# Altium footprint library IND_SMD.PcbLib: 118 footprints (part 1 of 8)
Each footprint in its own frame and in the unit in brackets; x right, y up, seen from the top. Pads: shape width x height; smd on the part's side, far side on the other; paste and mask are expansions set on the pad; w line width, h text height; cw(c..) or ccw(c..) is an arc to the next point about the centre after c.
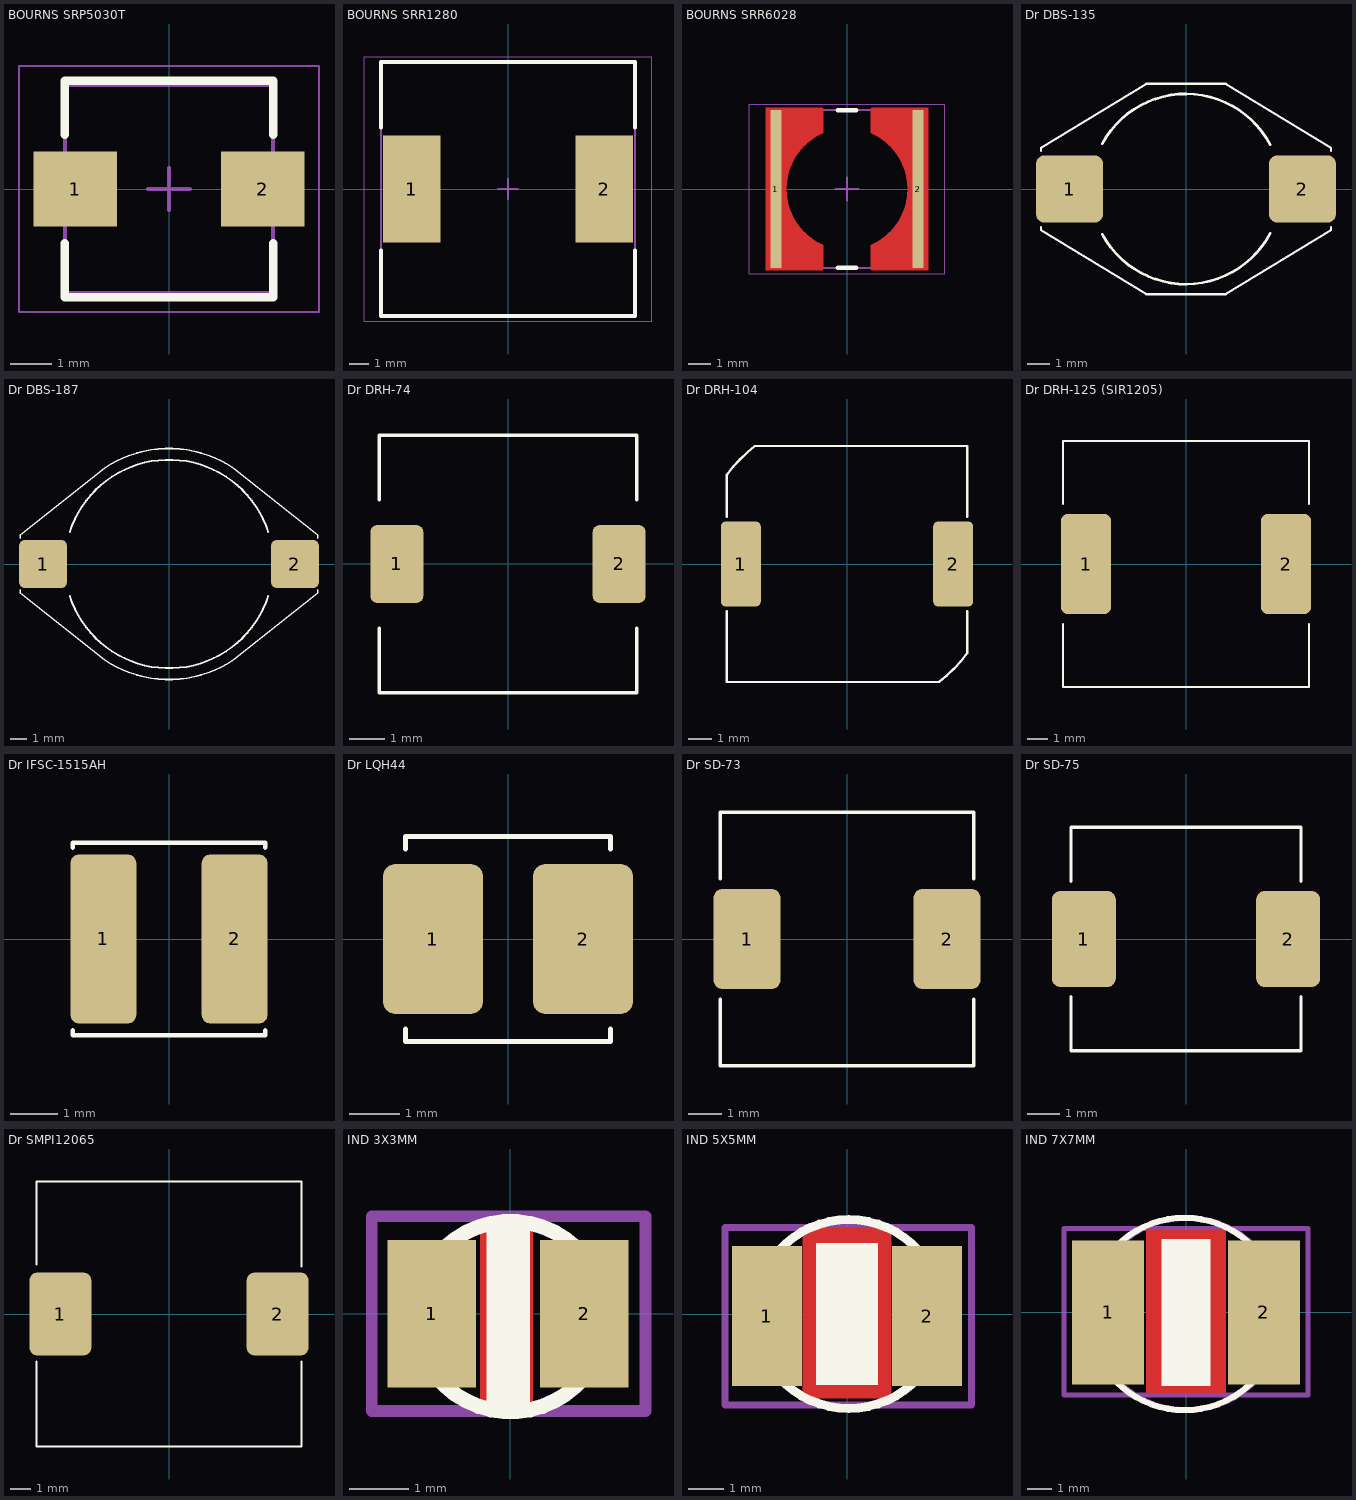
[diagram p0: the footprints below, top view; thin cyan lines are the x and y axes]

## BOURNS SRP5030T [mm] "Precision Wire Wound Inductor, 2-Leads, Body 5.70x5.20mm, IPC Medium Density"
height 3
pads (2):
  rect 2x1.8 smd: 1(-2.25,0) 2(2.25,0)
Top Overlay:
  lines w0.2: -2.5,-1.3 -2.5,-2.6 2.5,-2.6 2.5,-1.3 ; -2.5,1.3 -2.5,2.6 2.5,2.6 2.5,1.3
Mechanical 13:
  lines w0.1: -2.5,-2.5 -2.5,2.5 2.5,2.5 2.5,-2.5 -2.5,-2.5
Mechanical 15:
  lines w0.05: -3.6,-2.95 -3.6,2.95 3.6,2.95 3.6,-2.95 -3.6,-2.95
  lines w0.1: -0.5,0 0.5,0 ; 0,-0.5 0,0.5
3D body "Bourns SRP5030T.STEP": height 3, standoff 0, extent -2.85,-2.6 2.85,2.6

## BOURNS SRR1280 [mm] "Precision Wire Wound Inductor, 2-Leads, Body 12.50x12.50mm, IPC Medium Density"
height 8
pads (2):
  rect 2.9x5.4 smd: 1(-4.85,0) 2(4.85,0)
Top Overlay:
  lines w0.2: -6.4,-3.1 -6.4,-6.4 6.4,-6.4 6.4,-3.1 ; -6.4,3.1 -6.4,6.4 6.4,6.4 6.4,3.1
Mechanical 13:
  lines w0.1: -6.4,-6.4 -6.4,6.4 6.4,6.4 6.4,-6.4 -6.4,-6.4
Mechanical 15:
  lines w0.05: -7.225,-6.65 -7.225,6.65 7.225,6.65 7.225,-6.65 -7.225,-6.65
  lines w0.1: -0.5,0 0.5,0 ; 0,-0.5 0,0.5
3D body "SRR1280.STEP": height 7.9, standoff 0, extent -6.25,-6.25 6.25,6.25

## BOURNS SRR6028 [mm] "Precision Wire Wound Inductor, 2-Leads, Body 6.80x6.80mm, IPC Medium Density"
height 3
pads (2):
  rect 0.5x7 smd: 1(-3.15,0) 2(3.15,0)
Top Layer:
  region: 3.6,3.6 1.1,3.6 1.1,2.5 1.4,2.4 1.7,2.1 1.9,2 2.1,1.7 2.3,1.4 2.5,1 2.6,0.7 2.7,0.3 2.7,0 3.6,0
  region: 3.6,-3.6 1.1,-3.6 1.1,-2.5 1.4,-2.4 1.7,-2.1 1.9,-2 2.1,-1.7 2.3,-1.4 2.5,-1 2.6,-0.7 2.7,-0.3 2.7,0 3.6,0
  region: -3.6,-3.6 -1.1,-3.6 -1.1,-2.5 -1.4,-2.4 -1.7,-2.1 -1.9,-2 -2.1,-1.7 -2.3,-1.4 -2.5,-1 -2.6,-0.7 -2.7,-0.3 -2.7,0 -3.6,0
  region: -3.6,3.6 -1.1,3.6 -1.1,2.5 -1.4,2.4 -1.7,2.1 -1.9,2 -2.1,1.7 -2.3,1.4 -2.5,1 -2.6,0.7 -2.7,0.3 -2.7,0 -3.6,0
  lines w0.1: -1.1,-3.55 -1.1,-2.5 ; -1.1,-2.5 cw(c0,0) -2.731,0 cw(c0,0) -1.1,2.5 ; -1.1,2.5 -1.1,3.55 ; 1.1,-3.55 1.1,-2.5 ; 1.1,-2.5 ccw(c0,0) 2.731,0 ccw(c0,0) 1.1,2.5 ; 1.1,2.5 1.1,3.55
Top Overlay:
  lines w0.2: -0.4,-3.5 0.4,-3.5 ; -0.4,3.5 0.4,3.5
Mechanical 13:
  lines w0.1: -3.5,-3.5 3.5,-3.5 3.5,3.5 -3.5,3.5 -3.5,-3.5
Mechanical 15:
  lines w0.05: -4.325,-3.75 4.325,-3.75 4.325,3.75 -4.325,3.75 -4.325,-3.75
  lines w0.1: -0.5,0 0.5,0 ; 0,-0.5 0,0.5
3D body "Bourns SRR6028.STEP": height 2.8, standoff 0, extent -3.4,-3.4 3.4,3.4

## Dr DBS-135 [mm]
pads (2):
  rrect25% 3x3 smd: 1(-5.2,0) 2(5.2,0)
Top Overlay:
  lines w0.1: -6.48,-1.7 -6.48,-1.829 -1.778,-4.7 1.773,-4.7 ; -6.48,1.7 -6.48,1.829 -1.777,4.7 1.773,4.7 ; 1.777,4.7 6.479,1.83 ; 1.777,-4.7 6.48,-1.829 6.48,-1.7 ; 6.479,1.7 6.479,1.829
  lines w0.125: -3.741,-2.018 ccw(c0,0) 3.761,-1.979 ; -3.741,2.018 cw(c0,0) 3.761,1.979
3D body "DO3316P 13x9.4x5.2.STEP": height 5.21, standoff 0, extent -6.48,-4.7 6.48,4.7

## Dr DBS-187 [mm]
pads (2):
  rrect25% 3x3 smd: 1(-7.85,0) 2(7.85,0)
Top Overlay:
  lines w0.1: -9.27,-1.6 -9.27,-1.808 -4.027,-5.968 ; -9.27,1.614 -9.27,1.823 ; -9.27,1.808 -4.027,5.968 ; -4.027,-5.969 ccw(c0,0) 4.027,-5.969 ; -4.027,5.969 cw(c0,0) 4.027,5.969 ; 4.027,-5.968 9.27,-1.808 9.27,-1.6 ; 4.027,5.968 9.27,1.808 ; 9.27,1.614 9.27,1.823
  lines w0.125: -6.186,-1.996 ccw(c0,0) 6.186,-1.996 ; -6.186,1.995 cw(c0,0) 6.186,1.995
3D body "Dr DBS-187.STEP": height 4.85, standoff 0.1, extent -9.27,-7.2 9.27,7.3

## Dr DRH-74 [mm]
pads (2):
  rrect25% 1.5x2.2 smd: 1(-3.15,0) 2(3.15,0)
Top Overlay:
  lines w0.1: -3.65,-1.825 -3.65,-3.65 3.65,-3.65 3.65,-1.825 ; -3.65,1.825 -3.65,3.65 3.65,3.65 3.65,1.825
3D body "DR-74.STEP": height 4.35, standoff 0, extent -3.65,-3.65 3.65,3.65

## Dr DRH-104 [mm]
pads (2):
  rrect25% 1.7x3.6 smd: 1(-4.5,0) 2(4.5,0)
Top Overlay:
  lines w0.1: -5.1,-2 -5.1,-5 3.9,-5 ; -5.1,2 -5.1,3.794 ; -5.092,3.787 cw(c0,-0.007) -3.905,5 5.1,5 5.1,2 ; 3.902,-5.003 ccw(c0,0.007) 5.093,-3.786 ; 5.1,-3.786 5.1,-2
3D body "MSS1038 10x10x3.8.STEP": height 3.8, standoff -0.01, extent -5.105,-5 5.105,5

## Dr DRH-125 (SIR1205) [mm]
pads (2):
  rrect25% 2.5x5 smd: 1(-5,0) 2(5,0)
Top Overlay:
  lines w0.1: -6.15,-3 -6.15,-6.15 6.15,-6.15 6.15,-3 ; -6.15,3 -6.15,6.15 6.15,6.15 6.15,3
3D body "MSS1260 12x12x6.STEP": height 6.2, standoff 0.06, extent -6.15,-6.15 6.15,6.15

## Dr IFSC-1515AH [mm]
pads (2):
  rrect25% 1.4x3.6 smd: 1(-1.397,0) 2(1.397,0)
Top Overlay:
  lines w0.1: -2.05,-1.95 -2.05,-2.05 2.05,-2.05 2.05,-1.95 ; -2.05,1.95 -2.05,2.05 2.05,2.05 2.05,1.95
3D body "IFSC-1515AH.STEP": height 1.8, standoff 0, extent -1.975,-1.975 1.975,1.975

## Dr LQH44 [mm] "4x4x1.65mm"
height 1.65
pads (2):
  rrect25% 2x3 smd: 1(-1.5,0) 2(1.5,0)
Top Overlay:
  lines w0.1: -2.05,-1.8 -2.05,-2.05 2.05,-2.05 2.05,-1.8 ; -2.05,1.8 -2.05,2.05 2.05,2.05 2.05,1.8
3D body "LQH44PN P0.STEP": height 1.65, standoff 0, extent -2,-1.997 2,1.998

## Dr SD-73 [mm] "7x7x3.2mm"
height 3.2
pads (2):
  rrect25% 2x3 smd: 1(-3,0) 2(3,0)
Top Overlay:
  lines w0.1: -3.8,-1.8 -3.8,-3.8 3.8,-3.8 3.8,-1.8 ; -3.8,1.8 -3.8,3.8 3.8,3.8 3.8,1.8
3D body "DR73-74.STEP": height 3.55, standoff 0, extent -3.8,-3.8 3.8,3.8

## Dr SD-75 [mm] "7.3x7.3x5mm"
height 5
pads (2):
  rrect25% 2x3 smd: 1(-3.2,0) 2(3.2,0)
Top Overlay:
  lines w0.1: -3.6,-1.8 -3.6,-3.5 3.6,-3.5 3.6,-1.8 ; -3.6,1.8 -3.6,3.5 3.6,3.5 3.6,1.8
3D body "Dr SMD SLF7045T.STEP": height 4.61, standoff 0, extent -3.6,-3.5 3.6,3.5

## Dr SMPI12065 [mm]
pads (2):
  rrect25% 3x4 smd: 1(-5.25,0) 2(5.25,0)
Top Overlay:
  lines w0.1: -6.4,-2.3 -6.4,-6.4 6.4,-6.4 6.4,-2.3 ; -6.4,2.4 -6.4,6.4 6.4,6.4 6.4,2.3
3D body "AX02-30.STEP": height 5.99, standoff 0, extent -7.487,-6.639 7.487,6.655

## IND 3X3MM [mm]
pads (2):
  rect 1.5x2.5 smd: 1(-1.333,0) 2(1.25,0)
Top Layer:
  pour cut-out: -0.508,1.587 0.381,1.587 0.381,-1.587 -0.508,-1.587
Top Overlay:
  circle w0.254: c0,-0.05 r1.614
  rectangle: -0.406,-1.6 0.33,1.6
Mechanical 14:
  lines w0.2: -2.349,-1.651 2.286,-1.651 2.286,1.651 -0.064,1.651 -2.349,1.651 -2.349,-1.651
3D body "ind.stp": height 2.5, standoff 0, extent -1.5,-1.5 1.5,1.5

## IND 5X5MM [mm]
pads (2):
  rect 2x4 smd: 1(-2.286,-0.064) 2(2.286,-0.064)
Top Layer:
  pour cut-out: -1.27,2.476 -1.27,-2.413 1.27,-2.413 1.27,2.476
Top Overlay:
  circle w0.254: c0.05,0 r2.7
  rectangle: -0.889,-2.032 0.889,2.032
Mechanical 14:
  lines w0.2: -3.492,-2.603 -3.492,2.476 2.54,2.476 3.556,2.476 3.556,-2.286 3.556,-2.603 -3.492,-2.603
3D body "ind_5mm.stp": height 3.1, standoff 0.1, extent -2.45,-2.5 2.55,2.5

## IND 7X7MM [mm]
pads (2):
  rect 3x6 smd: 1(-3.238,0) 2(3.238,0)
Top Layer:
  pour cut-out: -1.651,3.429 1.651,3.429 1.651,-3.365 -1.651,-3.365
Top Overlay:
  circle w0.254: c-0.064,-0.064 r4
  rectangle: -1.016,-3.048 1.016,3.048
Mechanical 14:
  circle w0.254: c0,-0.064 r3.996
  lines w0.2: -5.08,-3.429 5.08,-3.429 5.08,3.492 4.889,3.492 -4.826,3.492 -5.08,3.492 -5.08,-3.429
3D body "ind-7mm.stp": height 3.95, standoff 0.15, extent -3.35,-3.35 3.45,3.45